# Altium footprint library PcbLib_ICs.PcbLib: 317 footprints (part 5 of 24)
Each footprint in its own frame and in the unit in brackets; x right, y up, seen from the top. Pads: shape width x height; smd on the part's side, far side on the other; paste and mask are expansions set on the pad; w line width, h text height; cw(c..) or ccw(c..) is an arc to the next point about the centre after c.
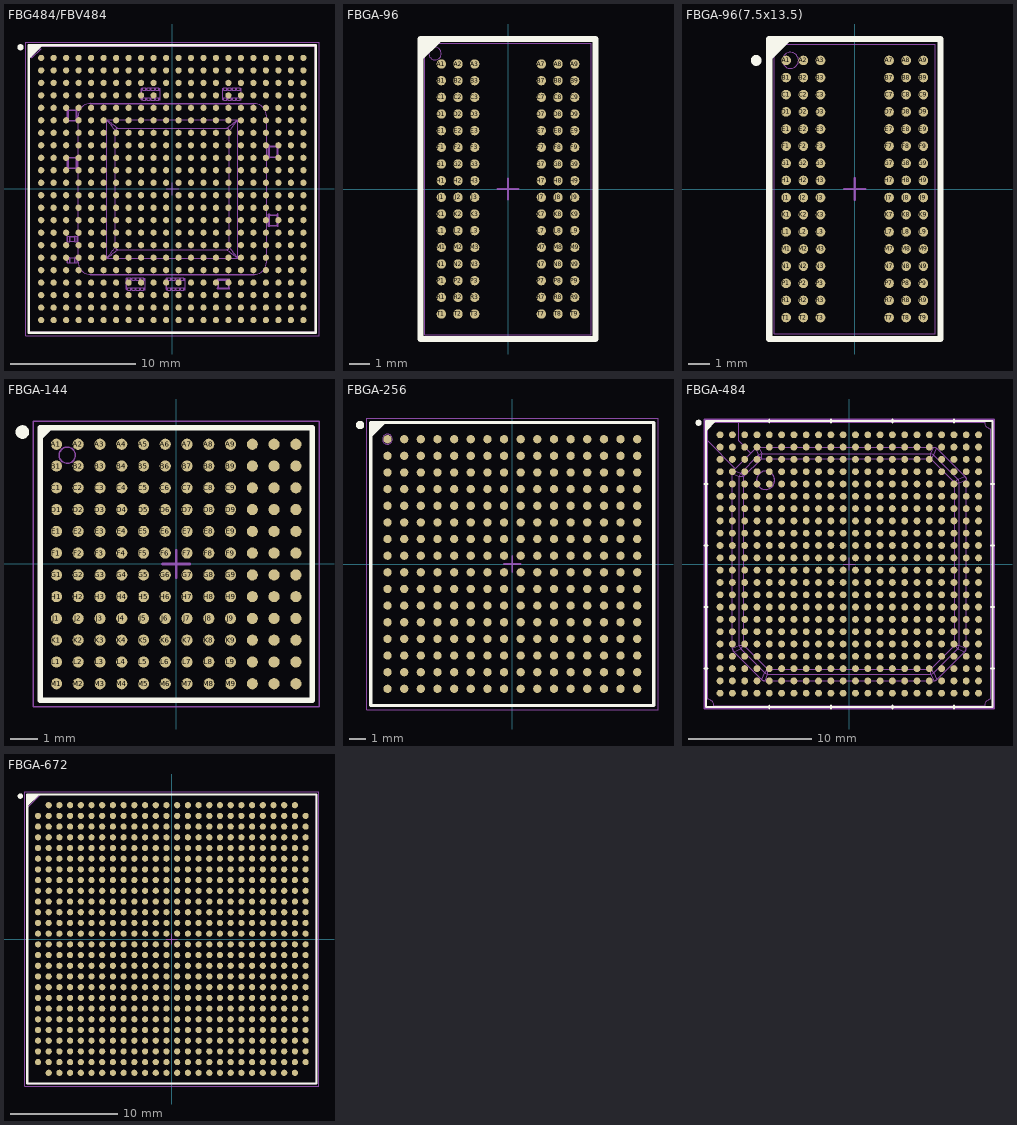
[diagram p4: the footprints below, top view; thin cyan lines are the x and y axes]

## FBG484/FBV484 [mm] "FBG484/FBV484 Package, 484-Leads, Body 23.00x23.00mmx2.54mm, Pitch 1.00mm"
height 2.54
pads (484):
  round 0.5 smd paste+0 mask+0.075: A1(-10.5,10.5) A2(-9.5,10.5) A3(-8.5,10.5) A4(-7.5,10.5) A5(-6.5,10.5) A6(-5.5,10.5) A7(-4.5,10.5) A8(-3.5,10.5) A9(-2.5,10.5) A10(-1.5,10.5) A11(-0.5,10.5) A12(0.5,10.5) A13(1.5,10.5) A14(2.5,10.5) A15(3.5,10.5) A16(4.5,10.5) A17(5.5,10.5) A18(6.5,10.5) A19(7.5,10.5) A20(8.5,10.5) A21(9.5,10.5) A22(10.5,10.5) AA1(-10.5,-9.5) AA2(-9.5,-9.5) AA3(-8.5,-9.5) AA4(-7.5,-9.5) AA5(-6.5,-9.5) AA6(-5.5,-9.5) AA7(-4.5,-9.5) AA8(-3.5,-9.5) AA9(-2.5,-9.5) AA10(-1.5,-9.5) AA11(-0.5,-9.5) AA12(0.5,-9.5) AA13(1.5,-9.5) AA14(2.5,-9.5) AA15(3.5,-9.5) AA16(4.5,-9.5) AA17(5.5,-9.5) AA18(6.5,-9.5) AA19(7.5,-9.5) AA20(8.5,-9.5) AA21(9.5,-9.5) AA22(10.5,-9.5) AB1(-10.5,-10.5) AB2(-9.5,-10.5) AB3(-8.5,-10.5) AB4(-7.5,-10.5) AB5(-6.5,-10.5) AB6(-5.5,-10.5) AB7(-4.5,-10.5) AB8(-3.5,-10.5) AB9(-2.5,-10.5) AB10(-1.5,-10.5) AB11(-0.5,-10.5) AB12(0.5,-10.5) AB13(1.5,-10.5) AB14(2.5,-10.5) AB15(3.5,-10.5) AB16(4.5,-10.5) AB17(5.5,-10.5) AB18(6.5,-10.5) AB19(7.5,-10.5) AB20(8.5,-10.5) AB21(9.5,-10.5) AB22(10.5,-10.5) B1(-10.5,9.5) B2(-9.5,9.5) B3(-8.5,9.5) B4(-7.5,9.5) B5(-6.5,9.5) B6(-5.5,9.5) B7(-4.5,9.5) B8(-3.5,9.5) B9(-2.5,9.5) B10(-1.5,9.5) B11(-0.5,9.5) B12(0.5,9.5) B13(1.5,9.5) B14(2.5,9.5) B15(3.5,9.5) B16(4.5,9.5) B17(5.5,9.5) B18(6.5,9.5) B19(7.5,9.5) B20(8.5,9.5) B21(9.5,9.5) B22(10.5,9.5) C1(-10.5,8.5) C2(-9.5,8.5) C3(-8.5,8.5) C4(-7.5,8.5) C5(-6.5,8.5) C6(-5.5,8.5) C7(-4.5,8.5) C8(-3.5,8.5) C9(-2.5,8.5) C10(-1.5,8.5) C11(-0.5,8.5) C12(0.5,8.5) C13(1.5,8.5) C14(2.5,8.5) C15(3.5,8.5) C16(4.5,8.5) C17(5.5,8.5) C18(6.5,8.5) C19(7.5,8.5) C20(8.5,8.5) C21(9.5,8.5) C22(10.5,8.5) D1(-10.5,7.5) D2(-9.5,7.5) D3(-8.5,7.5) D4(-7.5,7.5) D5(-6.5,7.5) D6(-5.5,7.5) D7(-4.5,7.5) D8(-3.5,7.5) D9(-2.5,7.5) D10(-1.5,7.5) D11(-0.5,7.5) D12(0.5,7.5) D13(1.5,7.5) D14(2.5,7.5) D15(3.5,7.5) D16(4.5,7.5) D17(5.5,7.5) D18(6.5,7.5) D19(7.5,7.5) D20(8.5,7.5) D21(9.5,7.5) D22(10.5,7.5) E1(-10.5,6.5) E2(-9.5,6.5) E3(-8.5,6.5) E4(-7.5,6.5) E5(-6.5,6.5) E6(-5.5,6.5) E7(-4.5,6.5) E8(-3.5,6.5) E9(-2.5,6.5) E10(-1.5,6.5) E11(-0.5,6.5) E12(0.5,6.5) E13(1.5,6.5) E14(2.5,6.5) E15(3.5,6.5) E16(4.5,6.5) E17(5.5,6.5) E18(6.5,6.5) E19(7.5,6.5) E20(8.5,6.5) E21(9.5,6.5) E22(10.5,6.5) F1(-10.5,5.5) F2(-9.5,5.5) F3(-8.5,5.5) F4(-7.5,5.5) F5(-6.5,5.5) F6(-5.5,5.5) F7(-4.5,5.5) F8(-3.5,5.5) F9(-2.5,5.5) F10(-1.5,5.5) F11(-0.5,5.5) F12(0.5,5.5) F13(1.5,5.5) F14(2.5,5.5) F15(3.5,5.5) F16(4.5,5.5) F17(5.5,5.5) F18(6.5,5.5) F19(7.5,5.5) F20(8.5,5.5) F21(9.5,5.5) F22(10.5,5.5) G1(-10.5,4.5) G2(-9.5,4.5) G3(-8.5,4.5) G4(-7.5,4.5) G5(-6.5,4.5) G6(-5.5,4.5) G7(-4.5,4.5) G8(-3.5,4.5) G9(-2.5,4.5) G10(-1.5,4.5) G11(-0.5,4.5) G12(0.5,4.5) G13(1.5,4.5) G14(2.5,4.5) G15(3.5,4.5) G16(4.5,4.5) G17(5.5,4.5) G18(6.5,4.5) G19(7.5,4.5) G20(8.5,4.5) G21(9.5,4.5) G22(10.5,4.5) H1(-10.5,3.5) H2(-9.5,3.5) H3(-8.5,3.5) H4(-7.5,3.5) H5(-6.5,3.5) H6(-5.5,3.5) H7(-4.5,3.5) H8(-3.5,3.5) H9(-2.5,3.5) H10(-1.5,3.5) H11(-0.5,3.5) H12(0.5,3.5) H13(1.5,3.5) H14(2.5,3.5) H15(3.5,3.5) H16(4.5,3.5) H17(5.5,3.5) H18(6.5,3.5) H19(7.5,3.5) H20(8.5,3.5) H21(9.5,3.5) H22(10.5,3.5) J1(-10.5,2.5) J2(-9.5,2.5) J3(-8.5,2.5) J4(-7.5,2.5) J5(-6.5,2.5) J6(-5.5,2.5) J7(-4.5,2.5) J8(-3.5,2.5) J9(-2.5,2.5) J10(-1.5,2.5) J11(-0.5,2.5) J12(0.5,2.5) J13(1.5,2.5) J14(2.5,2.5) J15(3.5,2.5) J16(4.5,2.5) J17(5.5,2.5) J18(6.5,2.5) J19(7.5,2.5) J20(8.5,2.5) J21(9.5,2.5) J22(10.5,2.5) K1(-10.5,1.5) K2(-9.5,1.5) K3(-8.5,1.5) K4(-7.5,1.5) K5(-6.5,1.5) K6(-5.5,1.5) K7(-4.5,1.5) K8(-3.5,1.5) K9(-2.5,1.5) K10(-1.5,1.5) K11(-0.5,1.5) K12(0.5,1.5) K13(1.5,1.5) K14(2.5,1.5) K15(3.5,1.5) K16(4.5,1.5) K17(5.5,1.5) K18(6.5,1.5) K19(7.5,1.5) K20(8.5,1.5) K21(9.5,1.5) K22(10.5,1.5) L1(-10.5,0.5) L2(-9.5,0.5) L3(-8.5,0.5) L4(-7.5,0.5) L5(-6.5,0.5) L6(-5.5,0.5) L7(-4.5,0.5) L8(-3.5,0.5) L9(-2.5,0.5) L10(-1.5,0.5) L11(-0.5,0.5) L12(0.5,0.5) L13(1.5,0.5) L14(2.5,0.5) L15(3.5,0.5) L16(4.5,0.5) L17(5.5,0.5) L18(6.5,0.5) L19(7.5,0.5) L20(8.5,0.5) L21(9.5,0.5) L22(10.5,0.5) M1(-10.5,-0.5) M2(-9.5,-0.5) M3(-8.5,-0.5) M4(-7.5,-0.5) M5(-6.5,-0.5) M6(-5.5,-0.5) M7(-4.5,-0.5) M8(-3.5,-0.5) M9(-2.5,-0.5) M10(-1.5,-0.5) M11(-0.5,-0.5) M12(0.5,-0.5) M13(1.5,-0.5) M14(2.5,-0.5) M15(3.5,-0.5) M16(4.5,-0.5) M17(5.5,-0.5) M18(6.5,-0.5) M19(7.5,-0.5) M20(8.5,-0.5) M21(9.5,-0.5) M22(10.5,-0.5) N1(-10.5,-1.5) N2(-9.5,-1.5) N3(-8.5,-1.5) N4(-7.5,-1.5) N5(-6.5,-1.5) N6(-5.5,-1.5) N7(-4.5,-1.5) N8(-3.5,-1.5) N9(-2.5,-1.5) N10(-1.5,-1.5) N11(-0.5,-1.5) N12(0.5,-1.5) N13(1.5,-1.5) N14(2.5,-1.5) N15(3.5,-1.5) N16(4.5,-1.5) N17(5.5,-1.5) N18(6.5,-1.5) N19(7.5,-1.5) N20(8.5,-1.5) N21(9.5,-1.5) N22(10.5,-1.5) P1(-10.5,-2.5) P2(-9.5,-2.5) P3(-8.5,-2.5) P4(-7.5,-2.5) P5(-6.5,-2.5) P6(-5.5,-2.5) P7(-4.5,-2.5) P8(-3.5,-2.5) P9(-2.5,-2.5) P10(-1.5,-2.5) P11(-0.5,-2.5) P12(0.5,-2.5) P13(1.5,-2.5) P14(2.5,-2.5) P15(3.5,-2.5) P16(4.5,-2.5) P17(5.5,-2.5) P18(6.5,-2.5) P19(7.5,-2.5) P20(8.5,-2.5) P21(9.5,-2.5) P22(10.5,-2.5) R1(-10.5,-3.5) R2(-9.5,-3.5) R3(-8.5,-3.5) R4(-7.5,-3.5) R5(-6.5,-3.5) R6(-5.5,-3.5) R7(-4.5,-3.5) R8(-3.5,-3.5) R9(-2.5,-3.5) R10(-1.5,-3.5) R11(-0.5,-3.5) R12(0.5,-3.5) R13(1.5,-3.5) R14(2.5,-3.5) R15(3.5,-3.5) R16(4.5,-3.5) R17(5.5,-3.5) R18(6.5,-3.5) R19(7.5,-3.5) R20(8.5,-3.5) R21(9.5,-3.5) R22(10.5,-3.5) T1(-10.5,-4.5) T2(-9.5,-4.5) T3(-8.5,-4.5) T4(-7.5,-4.5) T5(-6.5,-4.5) T6(-5.5,-4.5) T7(-4.5,-4.5) T8(-3.5,-4.5) T9(-2.5,-4.5) T10(-1.5,-4.5) T11(-0.5,-4.5) T12(0.5,-4.5) T13(1.5,-4.5) T14(2.5,-4.5) T15(3.5,-4.5) T16(4.5,-4.5) T17(5.5,-4.5) T18(6.5,-4.5) T19(7.5,-4.5) T20(8.5,-4.5) T21(9.5,-4.5) T22(10.5,-4.5) U1(-10.5,-5.5) U2(-9.5,-5.5) U3(-8.5,-5.5) U4(-7.5,-5.5) U5(-6.5,-5.5) U6(-5.5,-5.5) U7(-4.5,-5.5) U8(-3.5,-5.5) U9(-2.5,-5.5) U10(-1.5,-5.5) U11(-0.5,-5.5) U12(0.5,-5.5) U13(1.5,-5.5) U14(2.5,-5.5) U15(3.5,-5.5) U16(4.5,-5.5) U17(5.5,-5.5) U18(6.5,-5.5) U19(7.5,-5.5) U20(8.5,-5.5) U21(9.5,-5.5) U22(10.5,-5.5) V1(-10.5,-6.5) V2(-9.5,-6.5) V3(-8.5,-6.5) V4(-7.5,-6.5) V5(-6.5,-6.5) V6(-5.5,-6.5) V7(-4.5,-6.5) V8(-3.5,-6.5) V9(-2.5,-6.5) V10(-1.5,-6.5) V11(-0.5,-6.5) V12(0.5,-6.5) V13(1.5,-6.5) V14(2.5,-6.5) V15(3.5,-6.5) V16(4.5,-6.5) V17(5.5,-6.5) V18(6.5,-6.5) V19(7.5,-6.5) V20(8.5,-6.5) V21(9.5,-6.5) V22(10.5,-6.5) W1(-10.5,-7.5) W2(-9.5,-7.5) W3(-8.5,-7.5) W4(-7.5,-7.5) W5(-6.5,-7.5) W6(-5.5,-7.5) W7(-4.5,-7.5) W8(-3.5,-7.5) W9(-2.5,-7.5) W10(-1.5,-7.5) W11(-0.5,-7.5) W12(0.5,-7.5) W13(1.5,-7.5) W14(2.5,-7.5) W15(3.5,-7.5) W16(4.5,-7.5) W17(5.5,-7.5) W18(6.5,-7.5) W19(7.5,-7.5) W20(8.5,-7.5) W21(9.5,-7.5) W22(10.5,-7.5) Y1(-10.5,-8.5) Y2(-9.5,-8.5) Y3(-8.5,-8.5) Y4(-7.5,-8.5) Y5(-6.5,-8.5) Y6(-5.5,-8.5) Y7(-4.5,-8.5) Y8(-3.5,-8.5) Y9(-2.5,-8.5) Y10(-1.5,-8.5) Y11(-0.5,-8.5) Y12(0.5,-8.5) Y13(1.5,-8.5) Y14(2.5,-8.5) Y15(3.5,-8.5) Y16(4.5,-8.5) Y17(5.5,-8.5) Y18(6.5,-8.5) Y19(7.5,-8.5) Y20(8.5,-8.5) Y21(9.5,-8.5) Y22(10.5,-8.5)
Top Overlay:
  circle w0.25: c-12.15,11.35 r0.125
  region: -10.5,11.5 -11.5,10.5 -11.5,11.5
  lines w0.2: -11.5,10.5 -10.5,11.5 ; -11.5,-11.5 11.5,-11.5 11.5,11.5 -11.5,11.5 -11.5,-11.5
Top Assy:
  drawing of 1170 lines, arcs and shapes, not listed
  text ".Designator" at -3.443,-0.467 h2
Top Text:
  lines w0.05: -11.75,-11.75 11.75,-11.75 11.75,11.75 -11.75,11.75 -11.75,-11.75
  lines w0.1: -0.5,0 0.5,0 ; 0,-0.5 0,0.5
3D body "FBG484.STEP": height 2.41, standoff -0.06, extent -11.5,-11.5 11.5,11.5

## FBGA-96 [mm] "TFBGA-96 package with 0.8mm pitch, 9x13mm"
height 1.2
pads (96):
  round 0.45 smd paste+0 mask+0.05: A1(-3.2,6) A2(-2.4,6) A3(-1.6,6) A7(1.6,6) A8(2.4,6) A9(3.2,6) B1(-3.2,5.2) B2(-2.4,5.2) B3(-1.6,5.2) B7(1.6,5.2) B8(2.4,5.2) B9(3.2,5.2) C1(-3.2,4.4) C2(-2.4,4.4) C3(-1.6,4.4) C7(1.6,4.4) C8(2.4,4.4) C9(3.2,4.4) D1(-3.2,3.6) D2(-2.4,3.6) D3(-1.6,3.6) D7(1.6,3.6) D8(2.4,3.6) D9(3.2,3.6) E1(-3.2,2.8) E2(-2.4,2.8) E3(-1.6,2.8) E7(1.6,2.8) E8(2.4,2.8) E9(3.2,2.8) F1(-3.2,2) F2(-2.4,2) F3(-1.6,2) F7(1.6,2) F8(2.4,2) F9(3.2,2) G1(-3.2,1.2) G2(-2.4,1.2) G3(-1.6,1.2) G7(1.6,1.2) G8(2.4,1.2) G9(3.2,1.2) H1(-3.2,0.4) H2(-2.4,0.4) H3(-1.6,0.4) H7(1.6,0.4) H8(2.4,0.4) H9(3.2,0.4) J1(-3.2,-0.4) J2(-2.4,-0.4) J3(-1.6,-0.4) J7(1.6,-0.4) J8(2.4,-0.4) J9(3.2,-0.4) K1(-3.2,-1.2) K2(-2.4,-1.2) K3(-1.6,-1.2) K7(1.6,-1.2) K8(2.4,-1.2) K9(3.2,-1.2) L1(-3.2,-2) L2(-2.4,-2) L3(-1.6,-2) L7(1.6,-2) L8(2.4,-2) L9(3.2,-2) M1(-3.2,-2.8) M2(-2.4,-2.8) M3(-1.6,-2.8) M7(1.6,-2.8) M8(2.4,-2.8) M9(3.2,-2.8) N1(-3.2,-3.6) N2(-2.4,-3.6) N3(-1.6,-3.6) N7(1.6,-3.6) N8(2.4,-3.6) N9(3.2,-3.6) P1(-3.2,-4.4) P2(-2.4,-4.4) P3(-1.6,-4.4) P7(1.6,-4.4) P8(2.4,-4.4) P9(3.2,-4.4) R1(-3.2,-5.2) R2(-2.4,-5.2) R3(-1.6,-5.2) R7(1.6,-5.2) R8(2.4,-5.2) R9(3.2,-5.2) T1(-3.2,-6) T2(-2.4,-6) T3(-1.6,-6) T7(1.6,-6) T8(2.4,-6) T9(3.2,-6)
Top Overlay:
  region: -4.2,7.15 -3.15,7.15 -4.2,6.1
  lines w0.3: -4.2,-7.2 4.2,-7.2 4.2,7.2 -4.2,7.2 -4.2,-7.2
Top Assy:
  circle w0.05: c-3.5,6.5 r0.3
  lines w0.05: -4,-7 -4,7 4,7 4,-7 -4,-7
  text ".Designator" at -3.443,-0.467 h2
Top Text:
  lines w0.05: -4,-7 -4,7 4,7 4,-7 -4,-7
  lines w0.1: -0.5,0 0.5,0 ; 0,-0.5 0,0.5
3D body "FBGA-96(8x14).STEP": height 1.15, standoff -0.05, extent -4,-7 4,7

## FBGA-96(7.5x13.5) [mm] "FBGA-96 package with 0.8mm pitch, 7.5x13.5mm"
height 1.2
pads (96):
  round 0.45 smd paste+0 mask+0.05: A1(-3.2,6) A2(-2.4,6) A3(-1.6,6) A7(1.6,6) A8(2.4,6) A9(3.2,6) B1(-3.2,5.2) B2(-2.4,5.2) B3(-1.6,5.2) B7(1.6,5.2) B8(2.4,5.2) B9(3.2,5.2) C1(-3.2,4.4) C2(-2.4,4.4) C3(-1.6,4.4) C7(1.6,4.4) C8(2.4,4.4) C9(3.2,4.4) D1(-3.2,3.6) D2(-2.4,3.6) D3(-1.6,3.6) D7(1.6,3.6) D8(2.4,3.6) D9(3.2,3.6) E1(-3.2,2.8) E2(-2.4,2.8) E3(-1.6,2.8) E7(1.6,2.8) E8(2.4,2.8) E9(3.2,2.8) F1(-3.2,2) F2(-2.4,2) F3(-1.6,2) F7(1.6,2) F8(2.4,2) F9(3.2,2) G1(-3.2,1.2) G2(-2.4,1.2) G3(-1.6,1.2) G7(1.6,1.2) G8(2.4,1.2) G9(3.2,1.2) H1(-3.2,0.4) H2(-2.4,0.4) H3(-1.6,0.4) H7(1.6,0.4) H8(2.4,0.4) H9(3.2,0.4) J1(-3.2,-0.4) J2(-2.4,-0.4) J3(-1.6,-0.4) J7(1.6,-0.4) J8(2.4,-0.4) J9(3.2,-0.4) K1(-3.2,-1.2) K2(-2.4,-1.2) K3(-1.6,-1.2) K7(1.6,-1.2) K8(2.4,-1.2) K9(3.2,-1.2) L1(-3.2,-2) L2(-2.4,-2) L3(-1.6,-2) L7(1.6,-2) L8(2.4,-2) L9(3.2,-2) M1(-3.2,-2.8) M2(-2.4,-2.8) M3(-1.6,-2.8) M7(1.6,-2.8) M8(2.4,-2.8) M9(3.2,-2.8) N1(-3.2,-3.6) N2(-2.4,-3.6) N3(-1.6,-3.6) N7(1.6,-3.6) N8(2.4,-3.6) N9(3.2,-3.6) P1(-3.2,-4.4) P2(-2.4,-4.4) P3(-1.6,-4.4) P7(1.6,-4.4) P8(2.4,-4.4) P9(3.2,-4.4) R1(-3.2,-5.2) R2(-2.4,-5.2) R3(-1.6,-5.2) R7(1.6,-5.2) R8(2.4,-5.2) R9(3.2,-5.2) T1(-3.2,-6) T2(-2.4,-6) T3(-1.6,-6) T7(1.6,-6) T8(2.4,-6) T9(3.2,-6)
Top Overlay:
  circle w0.25: c-4.6,6 r0.125
  region: -4,7 -2.95,7 -4,5.95
  lines w0.3: -4,-7 -4,7 4,7 4,-7 -4,-7
Top Assy:
  circle w0.05: c-3,6 r0.375
  lines w0.05: -3.75,-6.75 -3.75,6.75 3.75,6.75 3.75,-6.75 -3.75,-6.75
  text ".Designator" at -3.443,-0.467 h2
Top Text:
  lines w0.1: -0.5,0 0.5,0 ; 0,-0.5 0,0.5
3D body "FBGA-96(7.5mmx13.5mm).STEP": height 1.45, standoff -0.04, extent -3.75,-6.75 3.75,6.75

## FBGA-144 [mm] "BGA, 144-Leads, Body 10.00x10.00mmx1.71mm, Pitch 0.80mm"
height 1.71
pads (144):
  round 0.41 smd paste+0 mask+0.075: A1(-4.4,4.4) A2(-3.6,4.4) A3(-2.8,4.4) A4(-2,4.4) A5(-1.2,4.4) A6(-0.4,4.4) A7(0.4,4.4) A8(1.2,4.4) A9(2,4.4) A10(2.8,4.4) A11(3.6,4.4) A12(4.4,4.4) B1(-4.4,3.6) B2(-3.6,3.6) B3(-2.8,3.6) B4(-2,3.6) B5(-1.2,3.6) B6(-0.4,3.6) B7(0.4,3.6) B8(1.2,3.6) B9(2,3.6) B10(2.8,3.6) B11(3.6,3.6) B12(4.4,3.6) C1(-4.4,2.8) C2(-3.6,2.8) C3(-2.8,2.8) C4(-2,2.8) C5(-1.2,2.8) C6(-0.4,2.8) C7(0.4,2.8) C8(1.2,2.8) C9(2,2.8) C10(2.8,2.8) C11(3.6,2.8) C12(4.4,2.8) D1(-4.4,2) D2(-3.6,2) D3(-2.8,2) D4(-2,2) D5(-1.2,2) D6(-0.4,2) D7(0.4,2) D8(1.2,2) D9(2,2) D10(2.8,2) D11(3.6,2) D12(4.4,2) E1(-4.4,1.2) E2(-3.6,1.2) E3(-2.8,1.2) E4(-2,1.2) E5(-1.2,1.2) E6(-0.4,1.2) E7(0.4,1.2) E8(1.2,1.2) E9(2,1.2) E10(2.8,1.2) E11(3.6,1.2) E12(4.4,1.2) F1(-4.4,0.4) F2(-3.6,0.4) F3(-2.8,0.4) F4(-2,0.4) F5(-1.2,0.4) F6(-0.4,0.4) F7(0.4,0.4) F8(1.2,0.4) F9(2,0.4) F10(2.8,0.4) F11(3.6,0.4) F12(4.4,0.4) G1(-4.4,-0.4) G2(-3.6,-0.4) G3(-2.8,-0.4) G4(-2,-0.4) G5(-1.2,-0.4) G6(-0.4,-0.4) G7(0.4,-0.4) G8(1.2,-0.4) G9(2,-0.4) G10(2.8,-0.4) G11(3.6,-0.4) G12(4.4,-0.4) H1(-4.4,-1.2) H2(-3.6,-1.2) H3(-2.8,-1.2) H4(-2,-1.2) H5(-1.2,-1.2) H6(-0.4,-1.2) H7(0.4,-1.2) H8(1.2,-1.2) H9(2,-1.2) H10(2.8,-1.2) H11(3.6,-1.2) H12(4.4,-1.2) J1(-4.4,-2) J2(-3.6,-2) J3(-2.8,-2) J4(-2,-2) J5(-1.2,-2) J6(-0.4,-2) J7(0.4,-2) J8(1.2,-2) J9(2,-2) J10(2.8,-2) J11(3.6,-2) J12(4.4,-2) K1(-4.4,-2.8) K2(-3.6,-2.8) K3(-2.8,-2.8) K4(-2,-2.8) K5(-1.2,-2.8) K6(-0.4,-2.8) K7(0.4,-2.8) K8(1.2,-2.8) K9(2,-2.8) K10(2.8,-2.8) K11(3.6,-2.8) K12(4.4,-2.8) L1(-4.4,-3.6) L2(-3.6,-3.6) L3(-2.8,-3.6) L4(-2,-3.6) L5(-1.2,-3.6) L6(-0.4,-3.6) L7(0.4,-3.6) L8(1.2,-3.6) L9(2,-3.6) L10(2.8,-3.6) L11(3.6,-3.6) L12(4.4,-3.6) M1(-4.4,-4.4) M2(-3.6,-4.4) M3(-2.8,-4.4) M4(-2,-4.4) M5(-1.2,-4.4) M6(-0.4,-4.4) M7(0.4,-4.4) M8(1.2,-4.4) M9(2,-4.4) M10(2.8,-4.4) M11(3.6,-4.4) M12(4.4,-4.4)
Top Overlay:
  circle w0.25: c-5.65,4.85 r0.125
  region: -4.656,5 -5,4.656 -5,5
  lines w0.2: -5,4.656 -4.656,5 ; -5,-5 -5,5 5,5 5,-5 -5,-5
Top Assy:
  circle w0.05: c-4,4 r0.3
  lines w0.05: -5,-5 -5,5 5,5 5,-5 -5,-5
  text ".Designator" at -3.443,-0.467 h2
Top Text:
  lines w0.05: -5.25,-5.25 -5.25,5.25 5.25,5.25 5.25,-5.25 -5.25,-5.25
  lines w0.1: -0.5,0 0.5,0 ; 0,-0.5 0,0.5
3D body "FBGA-144.step": height 1.71, standoff 0, extent -5,-5 5,5

## FBGA-256 [mm] "BGA, 256-Leads, Body 17.00x17.00mmx1.55mm, Pitch 1.00mm"
height 1.55
pads (256):
  round 0.5 smd paste+0 mask+0.05: A1(-7.5,7.5) A2(-6.5,7.5) A3(-5.5,7.5) A4(-4.5,7.5) A5(-3.5,7.5) A6(-2.5,7.5) A7(-1.5,7.5) A8(-0.5,7.5) A9(0.5,7.5) A10(1.5,7.5) A11(2.5,7.5) A12(3.5,7.5) A13(4.5,7.5) A14(5.5,7.5) A15(6.5,7.5) A16(7.5,7.5) B1(-7.5,6.5) B2(-6.5,6.5) B3(-5.5,6.5) B4(-4.5,6.5) B5(-3.5,6.5) B6(-2.5,6.5) B7(-1.5,6.5) B8(-0.5,6.5) B9(0.5,6.5) B10(1.5,6.5) B11(2.5,6.5) B12(3.5,6.5) B13(4.5,6.5) B14(5.5,6.5) B15(6.5,6.5) B16(7.5,6.5) C1(-7.5,5.5) C2(-6.5,5.5) C3(-5.5,5.5) C4(-4.5,5.5) C5(-3.5,5.5) C6(-2.5,5.5) C7(-1.5,5.5) C8(-0.5,5.5) C9(0.5,5.5) C10(1.5,5.5) C11(2.5,5.5) C12(3.5,5.5) C13(4.5,5.5) C14(5.5,5.5) C15(6.5,5.5) C16(7.5,5.5) D1(-7.5,4.5) D2(-6.5,4.5) D3(-5.5,4.5) D4(-4.5,4.5) D5(-3.5,4.5) D6(-2.5,4.5) D7(-1.5,4.5) D8(-0.5,4.5) D9(0.5,4.5) D10(1.5,4.5) D11(2.5,4.5) D12(3.5,4.5) D13(4.5,4.5) D14(5.5,4.5) D15(6.5,4.5) D16(7.5,4.5) E1(-7.5,3.5) E2(-6.5,3.5) E3(-5.5,3.5) E4(-4.5,3.5) E5(-3.5,3.5) E6(-2.5,3.5) E7(-1.5,3.5) E8(-0.5,3.5) E9(0.5,3.5) E10(1.5,3.5) E11(2.5,3.5) E12(3.5,3.5) E13(4.5,3.5) E14(5.5,3.5) E15(6.5,3.5) E16(7.5,3.5) F1(-7.5,2.5) F2(-6.5,2.5) F3(-5.5,2.5) F4(-4.5,2.5) F5(-3.5,2.5) F6(-2.5,2.5) F7(-1.5,2.5) F8(-0.5,2.5) F9(0.5,2.5) F10(1.5,2.5) F11(2.5,2.5) F12(3.5,2.5) F13(4.5,2.5) F14(5.5,2.5) F15(6.5,2.5) F16(7.5,2.5) G1(-7.5,1.5) G2(-6.5,1.5) G3(-5.5,1.5) G4(-4.5,1.5) G5(-3.5,1.5) G6(-2.5,1.5) G7(-1.5,1.5) G8(-0.5,1.5) G9(0.5,1.5) G10(1.5,1.5) G11(2.5,1.5) G12(3.5,1.5) G13(4.5,1.5) G14(5.5,1.5) G15(6.5,1.5) G16(7.5,1.5) H1(-7.5,0.5) H2(-6.5,0.5) H3(-5.5,0.5) H4(-4.5,0.5) H5(-3.5,0.5) H6(-2.5,0.5) H7(-1.5,0.5) H8(-0.5,0.5) H9(0.5,0.5) H10(1.5,0.5) H11(2.5,0.5) H12(3.5,0.5) H13(4.5,0.5) H14(5.5,0.5) H15(6.5,0.5) H16(7.5,0.5) J1(-7.5,-0.5) J2(-6.5,-0.5) J3(-5.5,-0.5) J4(-4.5,-0.5) J5(-3.5,-0.5) J6(-2.5,-0.5) J7(-1.5,-0.5) J8(-0.5,-0.5) J9(0.5,-0.5) J10(1.5,-0.5) J11(2.5,-0.5) J12(3.5,-0.5) J13(4.5,-0.5) J14(5.5,-0.5) J15(6.5,-0.5) J16(7.5,-0.5) K1(-7.5,-1.5) K2(-6.5,-1.5) K3(-5.5,-1.5) K4(-4.5,-1.5) K5(-3.5,-1.5) K6(-2.5,-1.5) K7(-1.5,-1.5) K8(-0.5,-1.5) K9(0.5,-1.5) K10(1.5,-1.5) K11(2.5,-1.5) K12(3.5,-1.5) K13(4.5,-1.5) K14(5.5,-1.5) K15(6.5,-1.5) K16(7.5,-1.5) L1(-7.5,-2.5) L2(-6.5,-2.5) L3(-5.5,-2.5) L4(-4.5,-2.5) L5(-3.5,-2.5) L6(-2.5,-2.5) L7(-1.5,-2.5) L8(-0.5,-2.5) L9(0.5,-2.5) L10(1.5,-2.5) L11(2.5,-2.5) L12(3.5,-2.5) L13(4.5,-2.5) L14(5.5,-2.5) L15(6.5,-2.5) L16(7.5,-2.5) M1(-7.5,-3.5) M2(-6.5,-3.5) M3(-5.5,-3.5) M4(-4.5,-3.5) M5(-3.5,-3.5) M6(-2.5,-3.5) M7(-1.5,-3.5) M8(-0.5,-3.5) M9(0.5,-3.5) M10(1.5,-3.5) M11(2.5,-3.5) M12(3.5,-3.5) M13(4.5,-3.5) M14(5.5,-3.5) M15(6.5,-3.5) M16(7.5,-3.5) N1(-7.5,-4.5) N2(-6.5,-4.5) N3(-5.5,-4.5) N4(-4.5,-4.5) N5(-3.5,-4.5) N6(-2.5,-4.5) N7(-1.5,-4.5) N8(-0.5,-4.5) N9(0.5,-4.5) N10(1.5,-4.5) N11(2.5,-4.5) N12(3.5,-4.5) N13(4.5,-4.5) N14(5.5,-4.5) N15(6.5,-4.5) N16(7.5,-4.5) P1(-7.5,-5.5) P2(-6.5,-5.5) P3(-5.5,-5.5) P4(-4.5,-5.5) P5(-3.5,-5.5) P6(-2.5,-5.5) P7(-1.5,-5.5) P8(-0.5,-5.5) P9(0.5,-5.5) P10(1.5,-5.5) P11(2.5,-5.5) P12(3.5,-5.5) P13(4.5,-5.5) P14(5.5,-5.5) P15(6.5,-5.5) P16(7.5,-5.5) R1(-7.5,-6.5) R2(-6.5,-6.5) R3(-5.5,-6.5) R4(-4.5,-6.5) R5(-3.5,-6.5) R6(-2.5,-6.5) R7(-1.5,-6.5) R8(-0.5,-6.5) R9(0.5,-6.5) R10(1.5,-6.5) R11(2.5,-6.5) R12(3.5,-6.5) R13(4.5,-6.5) R14(5.5,-6.5) R15(6.5,-6.5) R16(7.5,-6.5) T1(-7.5,-7.5) T2(-6.5,-7.5) T3(-5.5,-7.5) T4(-4.5,-7.5) T5(-3.5,-7.5) T6(-2.5,-7.5) T7(-1.5,-7.5) T8(-0.5,-7.5) T9(0.5,-7.5) T10(1.5,-7.5) T11(2.5,-7.5) T12(3.5,-7.5) T13(4.5,-7.5) T14(5.5,-7.5) T15(6.5,-7.5) T16(7.5,-7.5)
Top Overlay:
  circle w0.25: c-9.15,8.35 r0.125
  region: -8.5,8.5 -7.6,8.5 -8.5,7.6
  lines w0.2: -8.5,-8.5 -8.5,-7 -8.5,7 -8.5,8.5 -7,8.5 7,8.5 8.5,8.5 8.5,7 8.5,-7 8.5,-8.5 7,-8.5 -7,-8.5 -8.5,-8.5
Top Assy:
  circle w0.05: c-7.5,7.5 r0.3
  lines w0.05: -8.5,-8.5 8.5,-8.5 8.5,8.5 -8.5,8.5 -8.5,-8.5
  text ".Designator" at -3.443,-0.467 h2
Top Text:
  lines w0.05: -8.75,-8.75 8.75,-8.75 8.75,8.75 -8.75,8.75 -8.75,-8.75
  lines w0.1: -0.5,0 0.5,0 ; 0,-0.5 0,0.5
3D body "BGA256C100P16X16_1700X1700X155.step": height 1.55, standoff 0, extent -8.5,-8.5 8.5,8.5

## FBGA-484 [mil]
pads (484):
  round 22 smd paste+0 mask+1.97: A1(-413.39,413.38) A2(-374.02,413.38) A3(-334.65,413.38) A4(-295.28,413.38) A5(-255.91,413.38) A6(-216.54,413.38) A7(-177.17,413.38) A8(-137.8,413.38) A9(-98.43,413.38) A10(-59.06,413.38) A11(-19.69,413.38) A12(19.68,413.38) A13(59.06,413.38) A14(98.43,413.38) A15(137.8,413.38) A16(177.17,413.38) A17(216.54,413.38) A18(255.91,413.38) A19(295.28,413.38) A20(334.65,413.38) A21(374.02,413.38) A22(413.39,413.38) AA1(-413.39,-374.01) AA2(-374.02,-374.01) AA3(-334.65,-374.01) AA4(-295.28,-374.01) AA5(-255.91,-374.01) AA6(-216.54,-374.01) AA7(-177.17,-374.01) AA8(-137.8,-374.01) AA9(-98.43,-374.01) AA10(-59.06,-374.01) AA11(-19.69,-374.01) AA12(19.68,-374.01) AA13(59.06,-374.01) AA14(98.43,-374.01) AA15(137.8,-374.01) AA16(177.17,-374.01) AA17(216.54,-374.01) AA18(255.91,-374.01) AA19(295.28,-374.01) AA20(334.65,-374.01) AA21(374.02,-374.01) AA22(413.39,-374.01) AB1(-413.39,-413.38) AB2(-374.02,-413.38) AB3(-334.65,-413.38) AB4(-295.28,-413.38) AB5(-255.91,-413.38) AB6(-216.54,-413.38) AB7(-177.17,-413.38) AB8(-137.8,-413.38) AB9(-98.43,-413.38) AB10(-59.06,-413.38) AB11(-19.69,-413.38) AB12(19.68,-413.38) AB13(59.06,-413.38) AB14(98.43,-413.38) AB15(137.8,-413.38) AB16(177.17,-413.38) AB17(216.54,-413.38) AB18(255.91,-413.38) AB19(295.28,-413.38) AB20(334.65,-413.38) AB21(374.02,-413.38) AB22(413.39,-413.38) B1(-413.39,374.01) B2(-374.02,374.01) B3(-334.65,374.01) B4(-295.28,374.01) B5(-255.91,374.01) B6(-216.54,374.01) B7(-177.17,374.01) B8(-137.8,374.01) B9(-98.43,374.01) B10(-59.06,374.01) B11(-19.69,374.01) B12(19.68,374.01) B13(59.06,374.01) B14(98.43,374.01) B15(137.8,374.01) B16(177.17,374.01) B17(216.54,374.01) B18(255.91,374.01) B19(295.28,374.01) B20(334.65,374.01) B21(374.02,374.01) B22(413.39,374.01) C1(-413.39,334.64) C2(-374.02,334.64) C3(-334.65,334.64) C4(-295.28,334.64) C5(-255.91,334.64) C6(-216.54,334.64) C7(-177.17,334.64) C8(-137.8,334.64) C9(-98.43,334.64) C10(-59.06,334.64) C11(-19.69,334.64) C12(19.68,334.64) C13(59.06,334.64) C14(98.43,334.64) C15(137.8,334.64) C16(177.17,334.64) C17(216.54,334.64) C18(255.91,334.64) C19(295.28,334.64) C20(334.65,334.64) C21(374.02,334.64) C22(413.39,334.64) D1(-413.39,295.27) D2(-374.02,295.27) D3(-334.65,295.27) D4(-295.28,295.27) D5(-255.91,295.27) D6(-216.54,295.27) D7(-177.17,295.27) D8(-137.8,295.27) D9(-98.43,295.27) D10(-59.06,295.27) D11(-19.69,295.27) D12(19.68,295.27) D13(59.06,295.27) D14(98.43,295.27) D15(137.8,295.27) D16(177.17,295.27) D17(216.54,295.27) D18(255.91,295.27) D19(295.28,295.27) D20(334.65,295.27) D21(374.02,295.27) D22(413.39,295.27) E1(-413.39,255.91) E2(-374.02,255.91) E3(-334.65,255.91) E4(-295.28,255.91) E5(-255.91,255.91) E6(-216.54,255.91) E7(-177.17,255.91) E8(-137.8,255.91) E9(-98.43,255.91) E10(-59.06,255.91) E11(-19.69,255.91) E12(19.68,255.91) E13(59.06,255.91) E14(98.43,255.91) E15(137.8,255.91) E16(177.17,255.91) E17(216.54,255.91) E18(255.91,255.91) E19(295.28,255.91) E20(334.65,255.91) E21(374.02,255.91) E22(413.39,255.91) F1(-413.39,216.53) F2(-374.02,216.53) F3(-334.65,216.53) F4(-295.28,216.53) F5(-255.91,216.53) F6(-216.54,216.53) F7(-177.17,216.53) F8(-137.8,216.53) F9(-98.43,216.53) F10(-59.06,216.53) F11(-19.69,216.53) F12(19.68,216.53) F13(59.06,216.53) F14(98.43,216.53) F15(137.8,216.53) F16(177.17,216.53) F17(216.54,216.53) F18(255.91,216.53) F19(295.28,216.53) F20(334.65,216.53) F21(374.02,216.53) F22(413.39,216.53) G1(-413.39,177.16) G2(-374.02,177.16) G3(-334.65,177.16) G4(-295.28,177.16) G5(-255.91,177.16) G6(-216.54,177.16) G7(-177.17,177.16) G8(-137.8,177.16) G9(-98.43,177.16) G10(-59.06,177.16) G11(-19.69,177.16) G12(19.68,177.16) G13(59.06,177.16) G14(98.43,177.16) G15(137.8,177.16) G16(177.17,177.16) G17(216.54,177.16) G18(255.91,177.16) G19(295.28,177.16) G20(334.65,177.16) G21(374.02,177.16) G22(413.39,177.16) H1(-413.39,137.79) H2(-374.02,137.79) H3(-334.65,137.79) H4(-295.28,137.79) H5(-255.91,137.79) H6(-216.54,137.79) H7(-177.17,137.79) H8(-137.8,137.79) H9(-98.43,137.79) H10(-59.06,137.79) H11(-19.69,137.79) H12(19.68,137.79) H13(59.06,137.79) H14(98.43,137.79) H15(137.8,137.79) H16(177.17,137.79) H17(216.54,137.79) H18(255.91,137.79) H19(295.28,137.79) H20(334.65,137.79) H21(374.02,137.79) H22(413.39,137.79) J1(-413.39,98.42) J2(-374.02,98.42) J3(-334.65,98.42) J4(-295.28,98.42) J5(-255.91,98.42) J6(-216.54,98.42) J7(-177.17,98.42) J8(-137.8,98.42) J9(-98.43,98.42) J10(-59.06,98.42) J11(-19.69,98.42) J12(19.68,98.42) J13(59.06,98.42) J14(98.43,98.42) J15(137.8,98.42) J16(177.17,98.42) J17(216.54,98.42) J18(255.91,98.42) J19(295.28,98.42) J20(334.65,98.42) J21(374.02,98.42) J22(413.39,98.42) K1(-413.39,59.05) K2(-374.02,59.05) K3(-334.65,59.05) K4(-295.28,59.05) K5(-255.91,59.05) K6(-216.54,59.05) K7(-177.17,59.05) K8(-137.8,59.05) K9(-98.43,59.05) K10(-59.06,59.05) K11(-19.69,59.05) K12(19.68,59.05) K13(59.06,59.05) K14(98.43,59.05) K15(137.8,59.05) K16(177.17,59.05) K17(216.54,59.05) K18(255.91,59.05) K19(295.28,59.05) K20(334.65,59.05) K21(374.02,59.05) K22(413.39,59.05) L1(-413.39,19.68) L2(-374.02,19.68) L3(-334.65,19.68) L4(-295.28,19.68) L5(-255.91,19.68) L6(-216.54,19.68) L7(-177.17,19.68) L8(-137.8,19.68) L9(-98.43,19.68) L10(-59.06,19.68) L11(-19.69,19.68) L12(19.68,19.68) L13(59.06,19.68) L14(98.43,19.68) L15(137.8,19.68) L16(177.17,19.68) L17(216.54,19.68) L18(255.91,19.68) L19(295.28,19.68) L20(334.65,19.68) L21(374.02,19.68) L22(413.39,19.68) M1(-413.39,-19.68) M2(-374.02,-19.68) M3(-334.65,-19.68) M4(-295.28,-19.68) M5(-255.91,-19.68) M6(-216.54,-19.68) M7(-177.17,-19.68) M8(-137.8,-19.68) M9(-98.43,-19.68) M10(-59.06,-19.68) M11(-19.69,-19.68) M12(19.68,-19.68) M13(59.06,-19.68) M14(98.43,-19.68) M15(137.8,-19.68) M16(177.17,-19.68) M17(216.54,-19.68) M18(255.91,-19.68) M19(295.28,-19.68) M20(334.65,-19.68) M21(374.02,-19.68) M22(413.39,-19.68) N1(-413.39,-59.05) N2(-374.02,-59.05) N3(-334.65,-59.05) N4(-295.28,-59.05) N5(-255.91,-59.05) N6(-216.54,-59.05) N7(-177.17,-59.05) N8(-137.8,-59.05) N9(-98.43,-59.05) N10(-59.06,-59.05) N11(-19.69,-59.05) N12(19.68,-59.05) N13(59.06,-59.05) N14(98.43,-59.05) N15(137.8,-59.05) N16(177.17,-59.05) N17(216.54,-59.05) N18(255.91,-59.05) N19(295.28,-59.05) N20(334.65,-59.05) N21(374.02,-59.05) N22(413.39,-59.05) P1(-413.39,-98.42) P2(-374.02,-98.42) P3(-334.65,-98.42) P4(-295.28,-98.42) P5(-255.91,-98.42) P6(-216.54,-98.42) P7(-177.17,-98.42) P8(-137.8,-98.42) P9(-98.43,-98.42) P10(-59.06,-98.42) P11(-19.69,-98.42) P12(19.68,-98.42) P13(59.06,-98.42) P14(98.43,-98.42) P15(137.8,-98.42) P16(177.17,-98.42) P17(216.54,-98.42) P18(255.91,-98.42) P19(295.28,-98.42) P20(334.65,-98.42) P21(374.02,-98.42) P22(413.39,-98.42) R1(-413.39,-137.79) R2(-374.02,-137.79) R3(-334.65,-137.79) R4(-295.28,-137.79) R5(-255.91,-137.79) R6(-216.54,-137.79) R7(-177.17,-137.79) R8(-137.8,-137.79) R9(-98.43,-137.79) R10(-59.06,-137.79) R11(-19.69,-137.79) R12(19.68,-137.79) R13(59.06,-137.79) R14(98.43,-137.79) R15(137.8,-137.79) R16(177.17,-137.79) R17(216.54,-137.79) R18(255.91,-137.79) R19(295.28,-137.79) R20(334.65,-137.79) R21(374.02,-137.79) R22(413.39,-137.79) T1(-413.39,-177.16) T2(-374.02,-177.16) T3(-334.65,-177.16) T4(-295.28,-177.16) T5(-255.91,-177.16) T6(-216.54,-177.16) T7(-177.17,-177.16) T8(-137.8,-177.16) T9(-98.43,-177.16) T10(-59.06,-177.16) T11(-19.69,-177.16) T12(19.68,-177.16) T13(59.06,-177.16) T14(98.43,-177.16) T15(137.8,-177.16) T16(177.17,-177.16) T17(216.54,-177.16) T18(255.91,-177.16) T19(295.28,-177.16) T20(334.65,-177.16) T21(374.02,-177.16) T22(413.39,-177.16) U1(-413.39,-216.53) U2(-374.02,-216.53) U3(-334.65,-216.53) U4(-295.28,-216.53) U5(-255.91,-216.53) U6(-216.54,-216.53) U7(-177.17,-216.53) U8(-137.8,-216.53) U9(-98.43,-216.53) U10(-59.06,-216.53) U11(-19.69,-216.53) U12(19.68,-216.53) U13(59.06,-216.53) U14(98.43,-216.53) U15(137.8,-216.53) U16(177.17,-216.53) U17(216.54,-216.53) U18(255.91,-216.53) U19(295.28,-216.53) U20(334.65,-216.53) U21(374.02,-216.53) U22(413.39,-216.53) V1(-413.39,-255.91) V2(-374.02,-255.91) V3(-334.65,-255.91) V4(-295.28,-255.91) V5(-255.91,-255.91) V6(-216.54,-255.91) V7(-177.17,-255.91) V8(-137.8,-255.91) V9(-98.43,-255.91) V10(-59.06,-255.91) V11(-19.69,-255.91) V12(19.68,-255.91) V13(59.06,-255.91) V14(98.43,-255.91) V15(137.8,-255.91) V16(177.17,-255.91) V17(216.54,-255.91) V18(255.91,-255.91) V19(295.28,-255.91) V20(334.65,-255.91) V21(374.02,-255.91) V22(413.39,-255.91) W1(-413.39,-295.27) W2(-374.02,-295.27) W3(-334.65,-295.27) W4(-295.28,-295.27) W5(-255.91,-295.27) W6(-216.54,-295.27) W7(-177.17,-295.27) W8(-137.8,-295.27) W9(-98.43,-295.27) W10(-59.06,-295.27) W11(-19.69,-295.27) W12(19.68,-295.27) W13(59.06,-295.27) W14(98.43,-295.27) W15(137.8,-295.27) W16(177.17,-295.27) W17(216.54,-295.27) W18(255.91,-295.27) W19(295.28,-295.27) W20(334.65,-295.27) W21(374.02,-295.27) W22(413.39,-295.27) Y1(-413.39,-334.64) Y2(-374.02,-334.64) Y3(-334.65,-334.64) Y4(-295.28,-334.64) Y5(-255.91,-334.64) Y6(-216.54,-334.64) Y7(-177.17,-334.64) Y8(-137.8,-334.64) Y9(-98.43,-334.64) Y10(-59.06,-334.64) Y11(-19.69,-334.64) Y12(19.68,-334.64) Y13(59.06,-334.64) Y14(98.43,-334.64) Y15(137.8,-334.64) Y16(177.17,-334.64) Y17(216.54,-334.64) Y18(255.91,-334.64) Y19(295.28,-334.64) Y20(334.65,-334.64) Y21(374.02,-334.64) Y22(413.39,-334.64)